# Altium integrated library GPDSE.IntLib: 634 symbols (part 6 of 7) (continued)
## ULN2804A (continued)
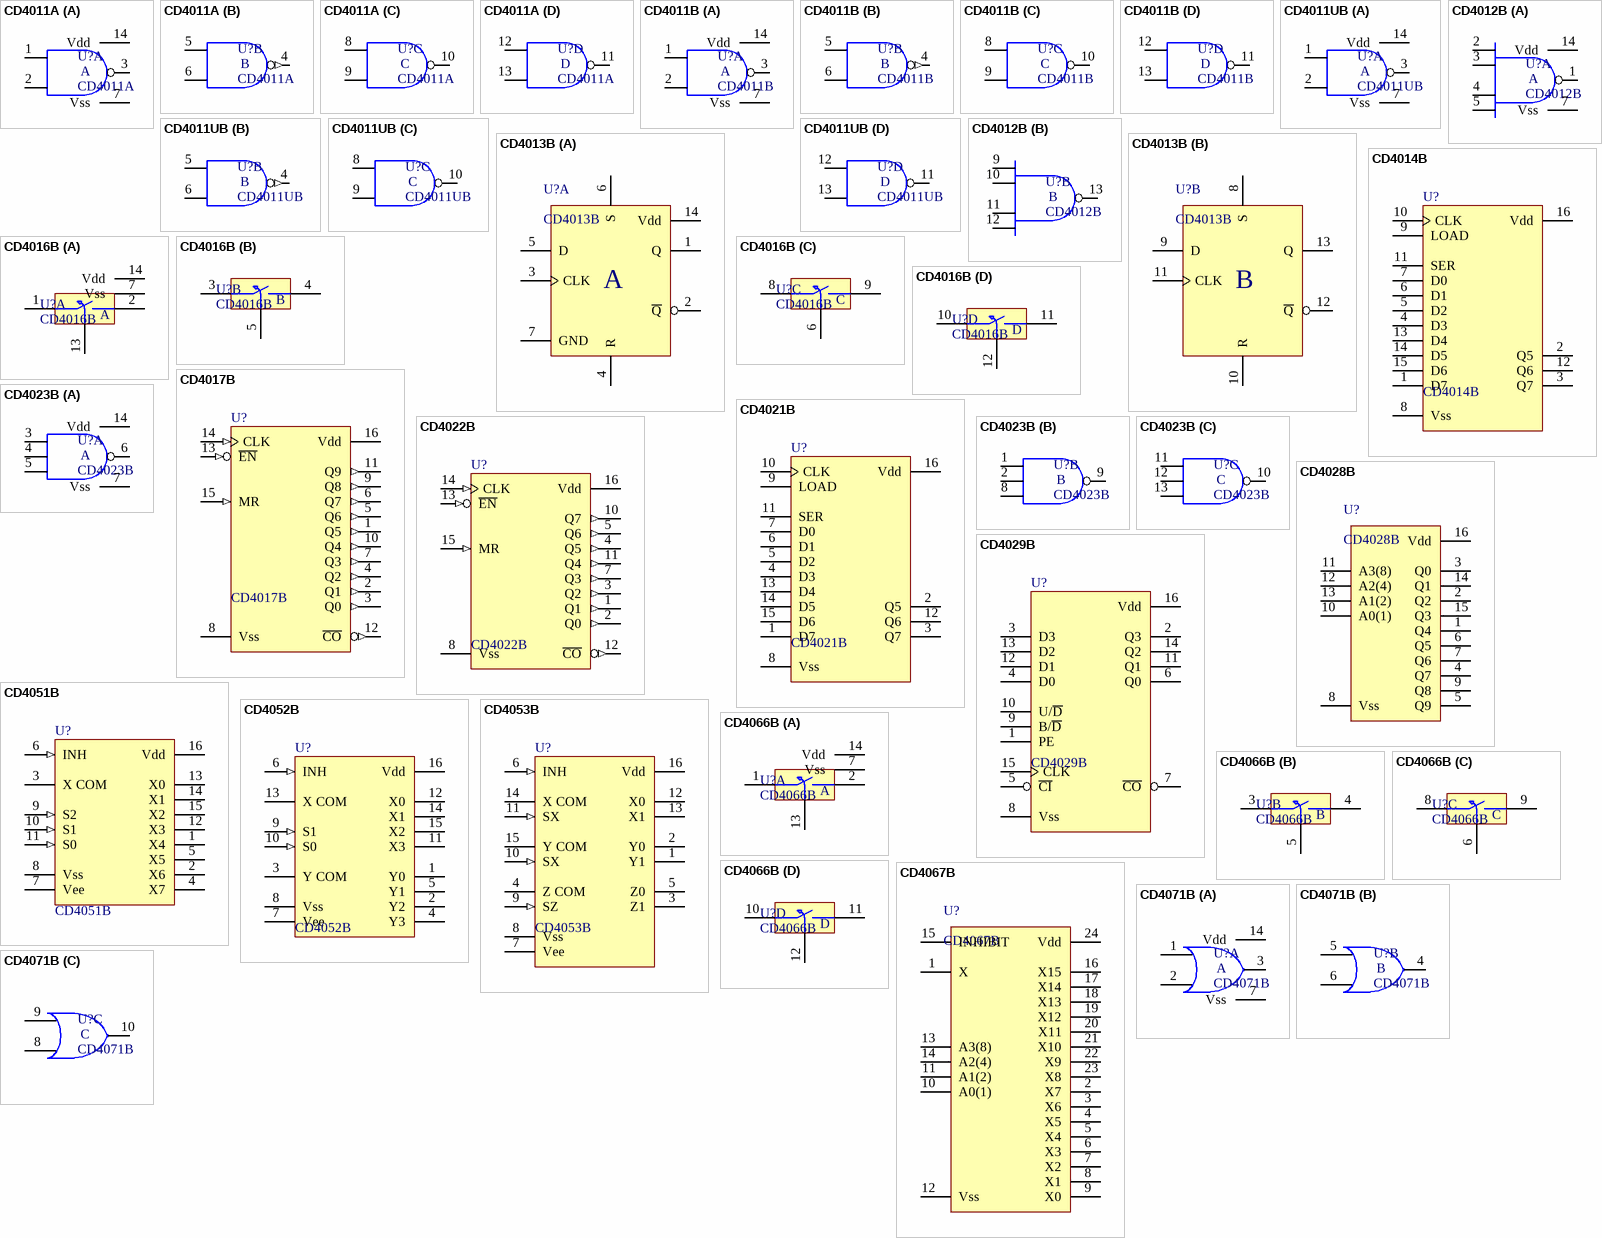
[diagram p28: symbols CD4011A to CD4071B]

## CD4011A
designator U?
[TI] Quad 2-Input NAND gates
footprint DIP14-300(100) (DIP, 14-Leads, Row Spacing 7.62mm, Pitch 2.54mm, Body 22.86x6.35mm)
part A pins: 1 A1, 2 B1, 3 Y1, 7 Vss, 14 Vdd
part B pins: 4 Y2 (out), 5 A2, 6 B2
part C pins: 8 A3, 9 B3, 10 Y3
part D pins: 11 Y4, 12 A4, 13 B4
part A text: A
part B text: B
part C text: C
part D text: D

## CD4011B
designator U?
[TI] Quad 2-Input NAND Gates
footprint DIP14-300(100) (DIP; 14 Leads; Row Spacing 7.62 mm; Pitch 2.54 mm; 3D CircuitWorks)
footprint SOIC14-150(50) (SOIC; 14 Leads; Row Spacing 3.81 mm; Pitch 1.27 mm; 3D Antonio Fagaldo)
footprint SOP14-4.4mm(0.65mm) (Thin Shrink Small Outline Package 14 pin)
footprint SOP14-5.3mm(1.27mm) (Small Outline Package 14 pin)
part A pins: 1 A1, 2 B1, 3 Y1, 7 Vss, 14 Vdd
part B pins: 4 Y2 (out), 5 A2, 6 B2
part C pins: 8 A3, 9 B3, 10 Y3
part D pins: 11 Y4, 12 A4, 13 B4
part A text: A
part B text: B
part C text: C
part D text: D

## CD4011UB
designator U?
[TI] Quad 2-Input NAND Gates
footprint DIP14-300(100) (DIP; 14 Leads; Row Spacing 7.62 mm; Pitch 2.54 mm; 3D CircuitWorks)
footprint SOIC14-150(50) (SOIC; 14 Leads; Row Spacing 3.81 mm; Pitch 1.27 mm; 3D Antonio Fagaldo)
footprint SOP14-4.4mm(0.65mm) (Thin Shrink Small Outline Package 14 pin)
footprint SOP14-5.3mm(1.27mm) (Small Outline Package 14 pin)
part A pins: 1 A1, 2 B1, 3 Y1, 7 Vss, 14 Vdd
part B pins: 4 Y2 (out), 5 A2, 6 B2
part C pins: 8 A3, 9 B3, 10 Y3
part D pins: 11 Y4, 12 A4, 13 B4
part A text: A
part B text: B
part C text: C
part D text: D

## CD4012B
designator U?
[TI] Dual 4-Input NAND Gates
footprint DIP14-300(100) (DIP; 14 Leads; Row Spacing 7.62 mm; Pitch 2.54 mm; 3D CircuitWorks)
footprint SOIC14-150(50) (SOIC; 14 Leads; Row Spacing 3.81 mm; Pitch 1.27 mm; 3D Antonio Fagaldo)
footprint SOP14-4.4mm(0.65mm) (Thin Shrink Small Outline Package 14 pin)
footprint SOP14-5.3mm(1.27mm) (Small Outline Package 14 pin)
part A pins: 1 Y1, 2 A1, 3 B1, 4 C1, 5 D1, 7 Vss, 14 Vdd
part B pins: 9 A2, 10 B2, 11 C2, 12 D2, 13 Y2
part A text: A
part B text: B

## CD4013B
designator U?
[TI] CMOS Dual D-Type Flip-Flop
footprint DIP14-300(100) (DIP, 14-Leads, Row Spacing 7.62mm, Pitch 2.54mm)
footprint SOIC14-150(50) (SOIC 14 Leads; Row Spacing 3.81 mm; Pitch 1.27 mm; 3D André L´Hérault)
footprint SOP14-4.4mm(0.65mm) (Thin Shrink Small Outline Package 14 pin)
footprint SOP14-5.3mm(1.27mm) (Small Outline Package 14 pin)
part A pins: 1 Q, 2 ~{Q}, 3 CLK, 4 R, 5 D, 6 S, 7 GND (power), 14 Vdd (power)
part B pins: 8 S, 9 D, 10 R, 11 CLK, 12 ~{Q}, 13 Q
3 alternate drawings of the same symbol
part A text: A
part B text: B

## CD4014B
designator U?
[TI] 8-Bit Shift Register with Synchronous Parallel Load
footprint DIP16-300(100) (DIP; 16 Leads; Row Spacing 7.62 mm; Pitch 2.54 mm; 3D CircuitWorks)
footprint SOIC16-150(50) (SOIC; 16 Leads; Row Spacing 3.81 mm; Pitch 1.27 mm; 3D Antonio Fagaldo)
footprint SOP16-4.4mm(0.65mm) (Thin Shrink Small Outline Package 16 pin)
pins: 1 D7, 2 Q5, 3 Q7, 4 D3, 5 D2, 6 D1, 7 D0, 8 Vss (power), 9 LOAD, 10 CLK, 11 SER, 12 Q6, 13 D4, 14 D5, 15 D6, 16 Vdd (power)

## CD4016B
designator U?
[TI] Quad Bilateral Switch
footprint DIP14-300(100) (DIP, 14-Leads, Row Spacing 7.62mm, Pitch 2.54mm)
footprint SOIC14-150(50) (Plastic Small Outline 14 pinos)
footprint SOP14-4.4mm(0.65mm) (Thin Shrink Small Outline Package 14 pin)
footprint SOP14-5.3mm(1.27mm) (Small Outline Package 14 pin)
part A pins: 1 IN/OUT, 2 OUT/IN, 7 Vss, 13 CONT, 14 Vdd
part B pins: 3 IN/OUT, 4 OUT/IN, 5 CONT
part C pins: 6 CONT, 8 IN/OUT, 9 OUT/IN
part D pins: 10 IN/OUT, 11 OUT/IN, 12 CONT
part A text: A
part B text: B
part C text: C
part D text: D

## CD4017B
designator U?
[TI] Decade Counter with 10 Decoded Outputs; Supply Voltage (Vcc): 4.75 to 5.25 V; Input Voltage (Vi): 0 to Vcc; Output High Current (Ioh): -0.8 mA; Output Low Current (Iol): 16 mA; Clock Frequency (fclock): 20 MHz; Output Voltage (Vo): 0 to Vcc
footprint DIP16-300(100) (DIP, 16-Leads, Row Spacing 7.62mm, Pitch 2.54mm, Body 22.86x6.35mm)
footprint SOIC16-150(50) (SOIC 16 Leads; Row Spacing 3.81 mm; Pitch 1.27 mm; 3D André L´Hérault)
footprint SOP16-5.3mm(1.27mm) (Small Outline Package 16 pin)
footprint SOP16-4.4mm(0.65mm) (Thin Shrink Small Outline Package 16 pin)
pins: 1 Q5 (out), 2 Q1 (out), 3 Q0 (out), 4 Q2 (out), 5 Q6 (out), 6 Q7 (out), 7 Q3 (out), 8 Vss (power), 9 Q8 (out), 10 Q4 (out), 11 Q9 (out), 12 ~{CO} (out), 13 ~{EN} (in), 14 CLK (in), 15 MR (in), 16 Vdd (power)

## CD4021B
designator U?
[TI] 8-Bit Shift Register with Asynchronous Parallel Load
footprint DIP16-300(100) (DIP; 16 Leads; Row Spacing 7.62 mm; Pitch 2.54 mm; 3D CircuitWorks)
footprint SOIC16-150(50) (SOIC; 16 Leads; Row Spacing 3.81 mm; Pitch 1.27 mm; 3D Antonio Fagaldo)
footprint SOP16-4.4mm(0.65mm) (Thin Shrink Small Outline Package 16 pin)
pins: 1 D7, 2 Q5, 3 Q7, 4 D3, 5 D2, 6 D1, 7 D0, 8 Vss (power), 9 LOAD, 10 CLK, 11 SER, 12 Q6, 13 D4, 14 D5, 15 D6, 16 Vdd (power)

## CD4022B
designator U?
[TI] Octal Counter with 8 Decoded Outputs; Supply Voltage (Vcc): 4.75 to 5.25 V; Input Voltage (Vi): 0 to Vcc; Output High Current (Ioh): -0.8 mA; Output Low Current (Iol): 16 mA; Clock Frequency (fclock): 20 MHz; Output Voltage (Vo): 0 to Vcc
footprint DIP16-300(100) (DIP, 16-Leads, Row Spacing 7.62mm, Pitch 2.54mm, Body 22.86x6.35mm)
footprint SOP16-5.3mm(1.27mm) (Small Outline Package 16 pin)
footprint SOP16-4.4mm(0.65mm) (Thin Shrink Small Outline Package 16 pin)
pins: 1 Q1 (out), 2 Q0 (out), 3 Q2 (out), 4 Q5 (out), 5 Q6 (out), 7 Q3 (out), 8 Vss (power), 10 Q7 (out), 11 Q4 (out), 12 ~{CO} (out), 13 ~{EN} (in), 14 CLK (in), 15 MR (in), 16 Vdd (power)

## CD4023B
designator U?
[TI] Triple 3-Input NAND Gates
footprint DIP14-300(100) (DIP; 14 Leads; Row Spacing 7.62 mm; Pitch 2.54 mm; 3D CircuitWorks)
footprint SOIC14-150(50) (SOIC; 14 Leads; Row Spacing 3.81 mm; Pitch 1.27 mm; 3D Antonio Fagaldo)
footprint SOP14-4.4mm(0.65mm) (Thin Shrink Small Outline Package 14 pin)
footprint SOP14-5.3mm(1.27mm) (Small Outline Package 14 pin)
part A pins: 3 A1, 4 B1, 5 C1, 6 Y1, 7 Vss, 14 Vdd
part B pins: 1 A2, 2 B2, 8 C2, 9 Y2
part C pins: 10 Y3, 11 A3, 12 B3, 13 C3
part A text: A
part B text: B
part C text: C

## CD4028B
designator U?
[TI] BCD-to-Decimal Decoder
footprint DIP16-300(100) (DIP, 16-Leads, Row Spacing 7.62mm, Pitch 2.54mm, Body 22.86x6.35mm)
footprint SOIC16-300(50) (Plastic Small Outline 16 pinos largo)
footprint SOP16-4.4mm(0.65mm) (Thin Shrink Small Outline Package 16 pin)
footprint SOP16-5.3mm(1.27mm) (Small Outline Package 16 pin)
pins: 1 Q4, 2 Q2, 3 Q0, 4 Q7, 5 Q9, 6 Q5, 7 Q6, 8 Vss, 9 Q8, 10 A0(1), 11 A3(8), 12 A2(4), 13 A1(2), 14 Q1, 15 Q3, 16 Vdd

## CD4029B
designator U?
[TI] Presettable Up/Down Counter; Supply Voltage (Vcc): 3 to 18 V; Input Voltage (Vi): 0 to Vcc; Output High Current (Ioh): -1 mA; Output Low Current (Iol): 1 mA; Clock Frequency (fclock): 5.5 MHz; Output Voltage (Vo): 0 to Vcc
footprint DIP16-300(100) (DIP, 16-Leads, Row Spacing 7.62mm, Pitch 2.54mm, Body 22.86x6.35mm)
footprint SOIC16-150(50) (SOIC 16 Leads; Row Spacing 3.81 mm; Pitch 1.27 mm; 3D André L´Hérault)
footprint SOP16-5.3mm(1.27mm) (Small Outline Package 16 pin)
footprint SOP16-4.4mm(0.65mm) (Thin Shrink Small Outline Package 16 pin)
pins: 1 PE, 2 Q3, 3 D3, 4 D0, 5 ~{CI}, 6 Q0, 7 ~{CO}, 8 Vss (power), 9 B/~{D}, 10 U/~{D}, 11 Q1, 12 D1, 13 D2, 14 Q2, 15 CLK, 16 Vdd (power)

## CD4051B
designator U?
[TI] Single 8-Channel Analog Multiplexer/Demultiplexer with Logic-Level Conversion
footprint DIP16-300(100) (DIP, 16-Leads, Row Spacing 7.62mm, Pitch 2.54mm, Body 22.86x6.35mm)
footprint SOP16-5.3mm(1.27mm) (Small Outline Package 16 pin)
footprint SOP16-4.4mm(0.65mm) (Thin Shrink Small Outline Package 16 pin)
footprint SOIC16-150(50) (SOIC 16 Leads; Row Spacing 3.81 mm; Pitch 1.27 mm; 3D André L´Hérault)
pins: 1 X4, 2 X6, 3 X COM, 4 X7, 5 X5, 6 INH (in), 7 Vee (power), 8 Vss (power), 9 S2 (in), 10 S1 (in), 11 S0 (in), 12 X3, 13 X0, 14 X1, 15 X2, 16 Vdd (power)

## CD4052B
designator U?
[TI] Single 8-Channel Analog Multiplexer/Demultiplexer with Logic-Level Conversion
footprint DIP16-300(100) (DIP, 16-Leads, Row Spacing 7.62mm, Pitch 2.54mm, Body 22.86x6.35mm)
footprint SOP16-5.3mm(1.27mm) (Small Outline Package 16 pin)
footprint SOP16-4.4mm(0.65mm) (Thin Shrink Small Outline Package 16 pin)
footprint SOIC16-150(50) (SOIC 16 Leads; Row Spacing 3.81 mm; Pitch 1.27 mm; 3D André L´Hérault)
pins: 1 Y0, 2 Y2, 3 Y COM, 4 Y3, 5 Y1, 6 INH (in), 7 Vee (power), 8 Vss (power), 9 S1 (in), 10 S0 (in), 11 X3, 12 X0, 13 X COM, 14 X1, 15 X2, 16 Vdd (power)

## CD4053B
designator U?
[TI] Single 8-Channel Analog Multiplexer/Demultiplexer with Logic-Level Conversion
footprint DIP16-300(100) (DIP, 16-Leads, Row Spacing 7.62mm, Pitch 2.54mm, Body 22.86x6.35mm)
footprint SOP16-5.3mm(1.27mm) (Small Outline Package 16 pin)
footprint SOP16-4.4mm(0.65mm) (Thin Shrink Small Outline Package 16 pin)
footprint SOIC16-150(50) (SOIC 16 Leads; Row Spacing 3.81 mm; Pitch 1.27 mm; 3D André L´Hérault)
pins: 1 Y1, 2 Y0, 3 Z1, 4 Z COM, 5 Z0, 6 INH (in), 7 Vee (power), 8 Vss (power), 9 SZ (in), 10 SX (in), 11 SX (in), 12 X0, 13 X1, 14 X COM, 15 Y COM, 16 Vdd (power)

## CD4066B
designator U?
[TI] Quad Bilateral Switch
footprint DIP14-300(100) (DIP, 14-Leads, Row Spacing 7.62mm, Pitch 2.54mm)
footprint SOIC14-150(50) (Plastic Small Outline 14 pinos)
footprint SOP14-4.4mm(0.65mm) (Thin Shrink Small Outline Package 14 pin)
footprint SOP14-5.3mm(1.27mm) (Small Outline Package 14 pin)
part A pins: 1 IN/OUT, 2 OUT/IN, 7 Vss, 13 CONT, 14 Vdd
part B pins: 3 IN/OUT, 4 OUT/IN, 5 CONT
part C pins: 6 CONT, 8 IN/OUT, 9 OUT/IN
part D pins: 10 IN/OUT, 11 OUT/IN, 12 CONT
part A text: A
part B text: B
part C text: C
part D text: D

## CD4067B
designator U?
[TI] 16-Channel Analog Multiplexer / Demultiplexer
footprint DIP24-600(100) (DIP; 24 Leads; Row Spacing 15.24 mm; Pitch 2.54 mm; 3D Michael Fiedler)
footprint SOIC24-300(50) (Plastic Small Outline 24 pin wide)
footprint SOP24-4.4mm(0.65mm) (Thin Shrink Small Outline Package 24 pin)
pins: 1 X, 2 X7, 3 X6, 4 X5, 5 X4, 6 X3, 7 X2, 8 X1, 9 X0, 10 A0(1), 11 A1(2), 12 Vss, 13 A3(8), 14 A2(4), 15 INHIBIT, 16 X15, 17 X14, 18 X13, 19 X12, 20 X11, 21 X10, 22 X9, 23 X8, 24 Vdd

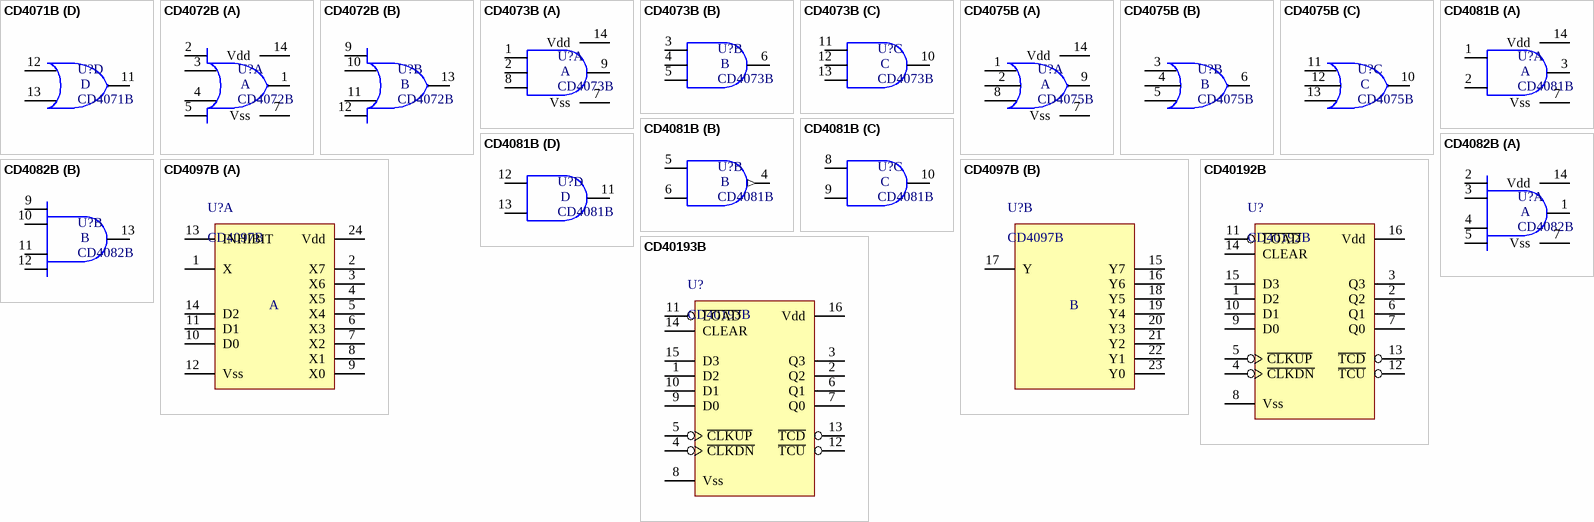
[diagram p29: symbols CD4071B to CD40193B]

## CD4071B
designator U?
[TI] Quad 2-Input OR Gates
footprint DIP14-300(100) (DIP; 14 Leads; Row Spacing 7.62 mm; Pitch 2.54 mm; 3D CircuitWorks)
footprint SOIC14-150(50) (SOIC; 14 Leads; Row Spacing 3.81 mm; Pitch 1.27 mm; 3D Antonio Fagaldo)
footprint SOP14-5.3mm(1.27mm) (Small Outline Package 14 pin)
footprint SOP14-4.4mm(0.65mm) (Thin Shrink Small Outline Package 14 pin)
part A pins: 1 A1, 2 B1, 3 Y1, 7 Vss, 14 Vdd
part B pins: 4 Y2, 5 A2, 6 B2
part C pins: 8 B3, 9 A3, 10 Y3
part D pins: 11 Y4, 12 A4, 13 B4
part A text: A
part B text: B
part C text: C
part D text: D

## CD4072B
designator U?
[TI] Dual 4-Input OR Gates
footprint DIP14-300(100) (DIP; 14 Leads; Row Spacing 7.62 mm; Pitch 2.54 mm; 3D CircuitWorks)
footprint SOIC14-150(50) (SOIC; 14 Leads; Row Spacing 3.81 mm; Pitch 1.27 mm; 3D Antonio Fagaldo)
footprint SOP14-5.3mm(1.27mm) (Small Outline Package 14 pin)
footprint SOP14-4.4mm(0.65mm) (Thin Shrink Small Outline Package 14 pin)
part A pins: 1 Y1, 2 A1, 3 B1, 4 C1, 5 D1, 7 Vss, 14 Vdd
part B pins: 9 A2, 10 B2, 11 C2, 12 D2, 13 Y2
part A text: A
part B text: B

## CD4073B
designator U?
[TI] Triple 3-Input AND Gates
footprint DIP14-300(100) (DIP, 14-Leads, Row Spacing 7.62mm, Pitch 2.54mm)
footprint SOIC14-150(50) (SOIC; 14 Leads; Row Spacing 3.81 mm; Pitch 1.27 mm; 3D Antonio Fagaldo)
footprint SOP14-4.4mm(0.65mm) (Thin Shrink Small Outline Package 14 pin)
footprint SOP14-5.3mm(1.27mm) (Small Outline Package 14 pin)
part A pins: 1 A1, 2 B1, 7 Vss, 8 C1, 9 Y1, 14 Vdd
part B pins: 3 A2, 4 B2, 5 C2, 6 Y2
part C pins: 10 Y3, 11 A3, 12 B3, 13 C3
part A text: A
part B text: B
part C text: C

## CD4075B
designator U?
[TI] Triple 3-Input OR Gates
footprint DIP14-300(100) (DIP; 14 Leads; Row Spacing 7.62 mm; Pitch 2.54 mm; 3D CircuitWorks)
footprint SOIC14-150(50) (SOIC; 14 Leads; Row Spacing 3.81 mm; Pitch 1.27 mm; 3D Antonio Fagaldo)
footprint SOP14-5.3mm(1.27mm) (Small Outline Package 14 pin)
footprint SOP14-4.4mm(0.65mm) (Thin Shrink Small Outline Package 14 pin)
part A pins: 1 A1, 2 B1, 7 Vss, 8 C1, 9 Y1, 14 Vdd
part B pins: 3 A2, 4 B2, 5 C2, 6 Y2
part C pins: 10 Y3, 11 A3, 12 B3, 13 C3
part A text: A
part B text: B
part C text: C

## CD4081B
designator U?
[TI] Quad 2-Input AND Gates
footprint DIP14-300(100) (DIP; 14 Leads; Row Spacing 7.62 mm; Pitch 2.54 mm; 3D CircuitWorks)
footprint SOIC14-150(50) (SOIC; 14 Leads; Row Spacing 3.81 mm; Pitch 1.27 mm; 3D Antonio Fagaldo)
footprint SOP14-4.4mm(0.65mm) (Thin Shrink Small Outline Package 14 pin)
footprint SOP14-5.3mm(1.27mm) (Small Outline Package 14 pin)
part A pins: 1 A1, 2 B1, 3 Y1, 7 Vss, 14 Vdd
part B pins: 4 Y2 (out), 5 A2, 6 B2
part C pins: 8 A3, 9 B3, 10 Y3
part D pins: 11 Y4, 12 A4, 13 B4
part A text: A
part B text: B
part C text: C
part D text: D

## CD4082B
designator U?
[TI] Dual 4-Input AND Gates
footprint DIP14-300(100) (DIP; 14 Leads; Row Spacing 7.62 mm; Pitch 2.54 mm; 3D CircuitWorks)
footprint SOIC14-150(50) (SOIC; 14 Leads; Row Spacing 3.81 mm; Pitch 1.27 mm; 3D Antonio Fagaldo)
footprint SOP14-4.4mm(0.65mm) (Thin Shrink Small Outline Package 14 pin)
footprint SOP14-5.3mm(1.27mm) (Small Outline Package 14 pin)
part A pins: 1 Y1, 2 A1, 3 B1, 4 C1, 5 D1, 7 Vss, 14 Vdd
part B pins: 9 A2, 10 B2, 11 C2, 12 D2, 13 Y2
part A text: A
part B text: B

## CD4097B
designator U?
[TI] Dual 8-Channel Analog Multiplexer / Demultiplexer
footprint DIP24-600(100) (DIP; 24 Leads; Row Spacing 15.24 mm; Pitch 2.54 mm; 3D Michael Fiedler)
footprint SOIC24-300(50) (Plastic Small Outline 24 pin wide)
footprint SOP24-4.4mm(0.65mm) (Thin Shrink Small Outline Package 24 pin)
part A pins: 1 X, 2 X7, 3 X6, 4 X5, 5 X4, 6 X3, 7 X2, 8 X1, 9 X0, 10 D0, 11 D1, 12 Vss, 13 INHIBIT, 14 D2, 24 Vdd
part B pins: 15 Y7, 16 Y6, 17 Y, 18 Y5, 19 Y4, 20 Y3, 21 Y2, 22 Y1, 23 Y0
part A text: A
part B text: B

## CD40192B
designator U?
[TI] Presettable Up/Down Decade Counters (Dual Clock With Reset)
footprint DIP16-300(100) (DIP; 16 Leads; Row Spacing 7.62 mm; Pitch 2.54 mm; 3D CircuitWorks)
footprint SOP16-5.3mm(1.27mm) (Small Outline Package 16 pin)
pins: 1 D2, 2 Q2, 3 Q3, 4 ~{CLKDN}, 5 ~{CLKUP}, 6 Q1, 7 Q0, 8 Vss, 9 D0, 10 D1, 11 ~{LOAD}, 12 ~{TCU}, 13 ~{TCD}, 14 CLEAR, 15 D3, 16 Vdd

## CD40193B
designator U?
[TI] Presettable Up/Down 4-bit Counters (Dual Clock With Reset)
footprint DIP16-300(100) (DIP; 16 Leads; Row Spacing 7.62 mm; Pitch 2.54 mm; 3D CircuitWorks)
footprint SOP16-5.3mm(1.27mm) (Small Outline Package 16 pin)
footprint SOP16-4.4mm(0.65mm) (Thin Shrink Small Outline Package 16 pin)
pins: 1 D2, 2 Q2, 3 Q3, 4 ~{CLKDN}, 5 ~{CLKUP}, 6 Q1, 7 Q0, 8 Vss, 9 D0, 10 D1, 11 ~{LOAD}, 12 ~{TCU}, 13 ~{TCD}, 14 CLEAR, 15 D3, 16 Vdd


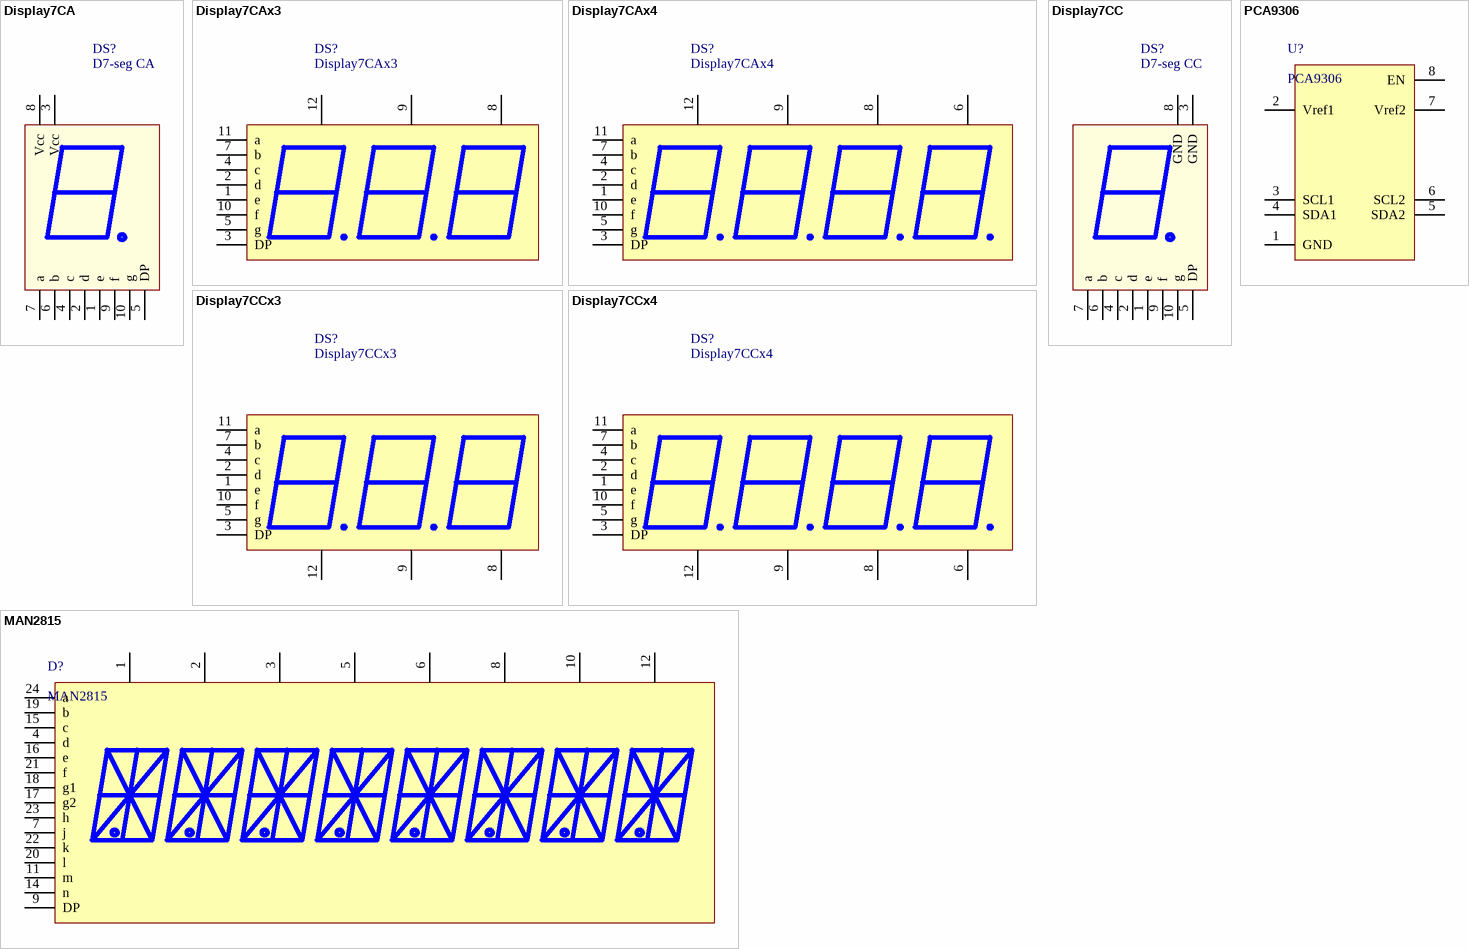
[diagram p30: symbols Display7CA to PCA9306]

## Display7CA
designator DS?, comment D7-seg CA
Seven Segments Display Common Anode
footprint D7S-13mm (Display 7 Segmentos 13 mm)
footprint D7S-10mm (Display 7 Segmentos 10 mm); pin to pad 1>4 2>5 4>7 5>6 6>9 7>10 9>2 10>1
footprint D7S-07mm (Display 7 Segmentos 7 mm); pin to pad 9>10 10>9
footprint D7S-25mm (Display 7 Segmentos 25 mm)
pins: 1 e, 2 d, 3 Vcc, 4 c, 5 DP, 6 b, 7 a, 8 Vcc, 9 f, 10 g

## Display7CAx3
designator DS?
3 Digits Seven Segments Display Common Anode
footprint D3042ASR (Triple 0.4" Display Common Anode - Ultra Bright Red)
footprint D3042AO (Triple 0.4" Display Common Anode - Red Orange)
footprint D3042AG (Triple 0.4" Display Common Anode - Yellow Green)
pins: 1 e, 2 d, 3 DP, 4 c, 5 g, 7 b, 8 D1, 9 D2, 10 f, 11 a, 12 D3

## Display7CAx4
designator DS?
4 Digits Seven Segments Display Common Anode
footprint D4156AB-14BL (Quadruple 0.56" Display Common Anode - Ultra Bright Blue)
footprint D4156AG (Quadruple 0.56" Display Common Anode - Yellow Green)
footprint D4156AO (Quadruple 0.56" Display Common Anode - Red Orange)
footprint D4156ASR (Quadruple 0.56" Display Common Anode - Ultra Bright Red)
pins: 1 e, 2 d, 3 DP, 4 c, 5 g, 6 D0, 7 b, 8 D1, 9 D2, 10 f, 11 a, 12 D3

## Display7CC
designator DS?, comment D7-seg CC
Seven Segments Display Common Cathode
footprint D7S-13mm (Display 7 Segmentos 13 mm)
footprint D7S-10mm (Display 7 Segmentos 10 mm); pin to pad 1>4 2>5 4>7 5>6 6>9 7>10 9>2 10>1
footprint D7S-07mm (Display 7 Segmentos 7 mm); pin to pad 9>10 10>9
footprint D7S-25mm (Display 7 Segmentos 25 mm)
pins: 1 e, 2 d, 3 GND, 4 c, 5 DP, 6 b, 7 a, 8 GND, 9 f, 10 g

## Display7CCx3
designator DS?
3 Digits Seven Segments Display Common Cathode
footprint D3042KSR (Triple 0.4" Display Common Cathode - Ultra Bright Red)
footprint D3042KO (Triple 0.4" Display Common Cathode - Red Orange)
footprint D3042KG (Triple 0.4" Display Common Cathode - Yellow Green)
pins: 1 e, 2 d, 3 DP, 4 c, 5 g, 7 b, 8 D1, 9 D2, 10 f, 11 a, 12 D3

## Display7CCx4
designator DS?
4 Digits Seven Segments Display Common Cathode
footprint D4156KB-14BL (Footprint not found)
footprint D4156KG (Footprint not found)
footprint D4156KO (Footprint not found)
footprint D4156KSR (Footprint not found)
pins: 1 e, 2 d, 3 DP, 4 c, 5 g, 6 D0, 7 b, 8 D1, 9 D2, 10 f, 11 a, 12 D3

## MAN2815
designator D?
8-Digits 14-Segments Alfanumeric Common Cathode Display
footprint MAN2815 (8-Digits 14-Segments Alfanumeric Common Cathode Display)
pins: 1 D7, 2 D6, 3 D5, 4 d, 5 D4, 6 D3, 7 j, 8 D2, 9 DP, 10 D1, 11 m, 12 D0, 14 n, 15 c, 16 e, 17 g2, 18 g1, 19 b, 20 l, 21 f, 22 k, 23 h, 24 a

## PCA9306
designator U?
Dual Bidirectional I2C Bus and SMBus Voltage-Level Translator; Reference Voltage (Vref): 0 - 5.5 V
footprint SOP08-2.8mm(0.65mm) (Small Outline Package; 8 leads; Row Spacing 2.8 mm; Pitch 0.65 mm)
pins: 1 GND, 2 Vref1, 3 SCL1, 4 SDA1, 5 SDA2, 6 SCL2, 7 Vref2, 8 EN


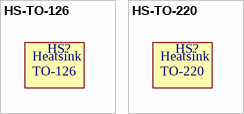
[diagram p31: symbols HS-TO-126 to HS-TO-220]

## HS-TO-126
designator HS?  (value not drawn)
Heatsink TO-126
footprint HS-TO-126-180847 (Heatsink TO-126 180847)
text: Heatsink; TO-126

## HS-TO-220
designator HS?  (value not drawn)
Heatsink TO-220
footprint HS-TO-220-180847 (Heatsink TO-220 180847 180847 19x9.5x19mm)
footprint HS-TO-220-183003-50 (Heatsink TO-220 183003-50 70x21x50mm)
footprint HS-TO-220-183004-37 (Heatsink TO-220 183004-37 86x20x37mm)
footprint HS-TO-220-183012 (Heatsink TO220 183012)
text: Heatsink; TO-220


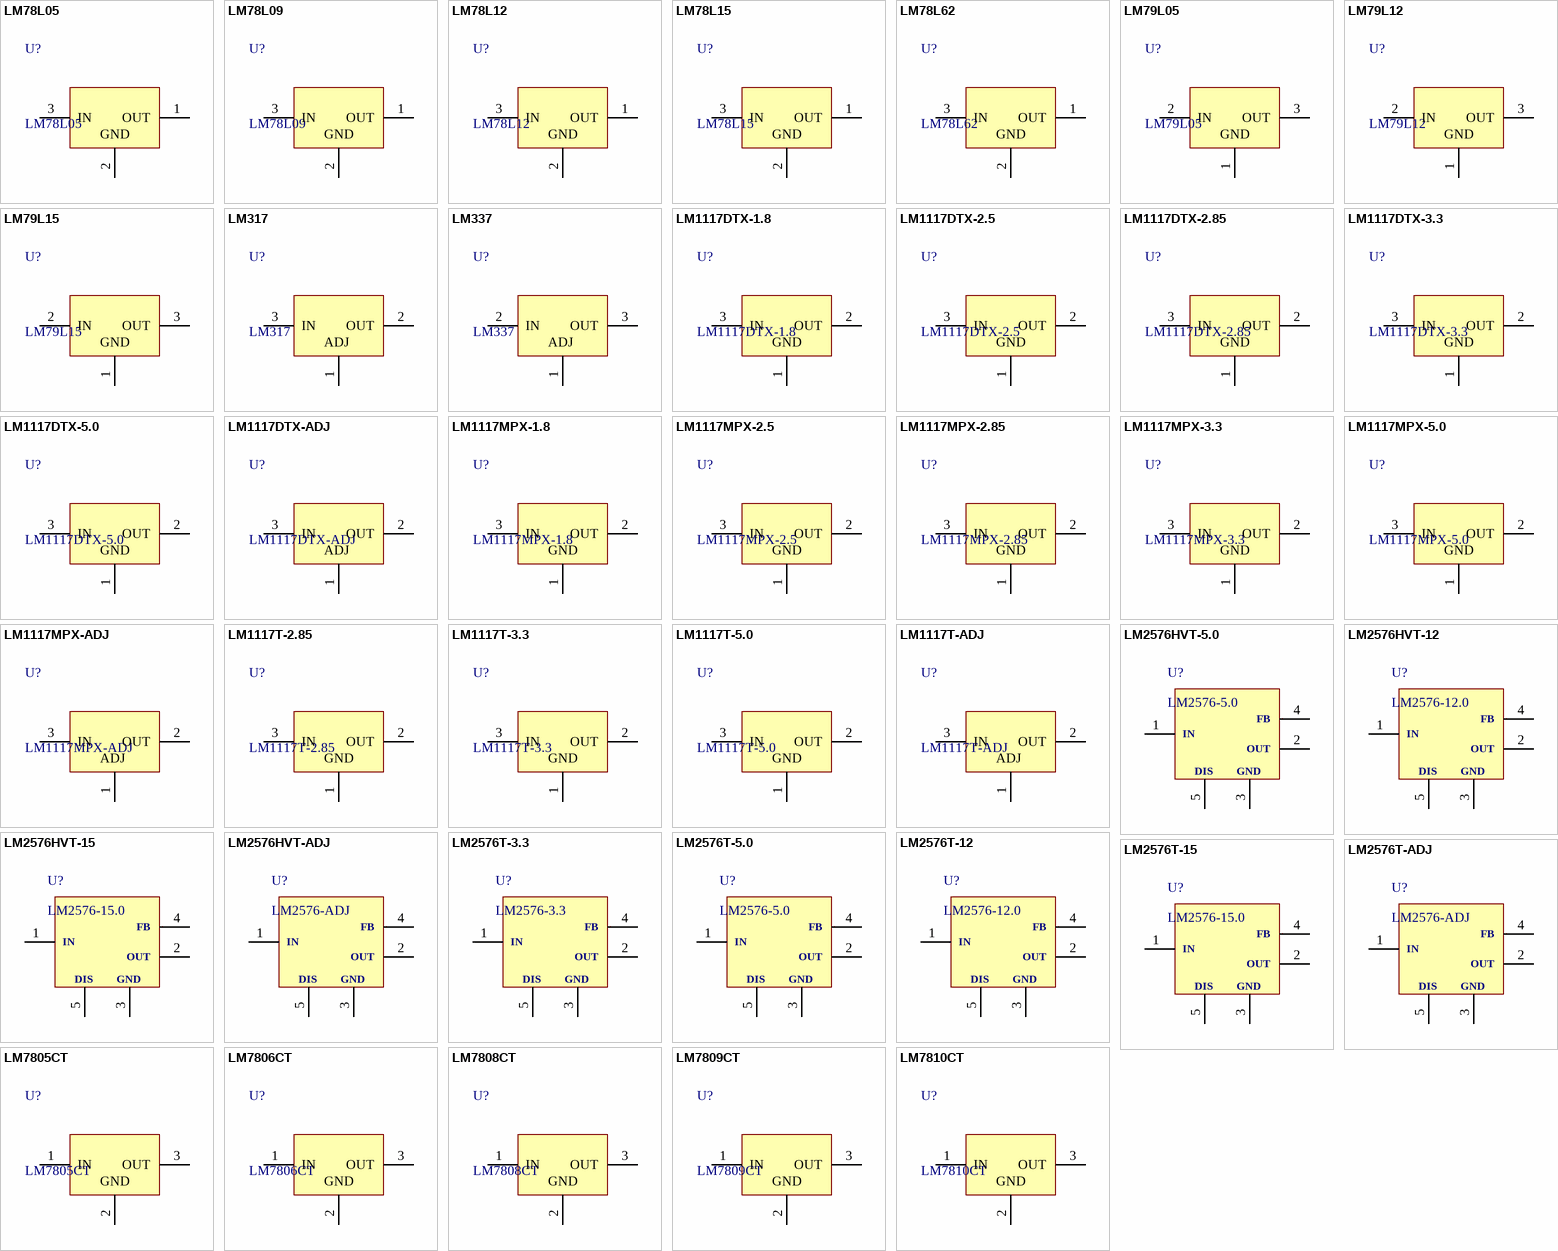
[diagram p32: symbols LM78L05 to LM7810CT]

## LM78L05
designator U?
3-Terminal 100 mA Positive 5 V Voltage Regulator
footprint TO-92/123 (Transistor Outline Package, Case Style 92 123; 3D Sergey Atanov)
pins: 1 OUT, 2 GND, 3 IN

## LM78L09
designator U?
3-Terminal 100 mA Positive 9 V Voltage Regulator
footprint TO-92/123 (Transistor Outline Package, Case Style 92 123; 3D Sergey Atanov)
pins: 1 OUT, 2 GND, 3 IN

## LM78L12
designator U?
3-Terminal 100 mA Positive 12 V Voltage Regulator
footprint TO-92/123 (Transistor Outline Package, Case Style 92 123; 3D Sergey Atanov)
pins: 1 OUT, 2 GND, 3 IN

## LM78L15
designator U?
3-Terminal 100 mA Positive 15 V Voltage Regulator
footprint TO-92/123 (Transistor Outline Package, Case Style 92 123; 3D Sergey Atanov)
pins: 1 OUT, 2 GND, 3 IN

## LM78L62
designator U?
3-Terminal 100 mA Positive 6.2 V Voltage Regulator
footprint TO-92/123 (Transistor Outline Package, Case Style 92 123; 3D Sergey Atanov)
pins: 1 OUT, 2 GND, 3 IN

## LM79L05
designator U?
3-Terminal 100 mA Negative 5 V Voltage Regulator
footprint TO-92/123 (Transistor Outline Package, Case Style 92 123; 3D Sergey Atanov)
pins: 1 GND, 2 IN, 3 OUT

## LM79L12
designator U?
3-Terminal 100 mA Negative 12 V Voltage Regulator
footprint TO-92/123 (Transistor Outline Package, Case Style 92 123; 3D Sergey Atanov)
pins: 1 GND, 2 IN, 3 OUT

## LM79L15
designator U?
3-Terminal 100 mA Negative 15 V Voltage Regulator
footprint TO-92/123 (Transistor Outline Package, Case Style 92 123; 3D Sergey Atanov)
pins: 1 GND, 2 IN, 3 OUT

## LM317
designator U?
3-Terminal 1.5 A Positive Adjustable Voltage Regulator
footprint TO-220/123 (TO, Thru-Hole, Vertical, Heatsink Mounted; 3 In-Line Leads; Pitch 2.54 mm)
footprint SOT-223/4 (SOT-223 DCY)
pins: 1 ADJ, 2 OUT, 3 IN

## LM337
designator U?
3-Terminal 1.5 A Negative Adjustable Voltage Regulator
footprint TO-220/123 (TO, Thru-Hole, Vertical, Heatsink Mounted; 3 In-Line Leads; Pitch 2.54 mm)
footprint SOT-223/4 (SOT-223 DCY)
pins: 1 ADJ, 2 IN, 3 OUT

## LM1117DTX-1.8
designator U?
Positive 1.8 V Regulator
footprint TO-252/4 (PowerFLEX Plastic Flange-Mount)
pins: 1 GND, 2 OUT, 3 IN

## LM1117DTX-2.5
designator U?
Positive 2.5 V Regulator
footprint TO-252/4 (PowerFLEX Plastic Flange-Mount)
pins: 1 GND, 2 OUT, 3 IN

## LM1117DTX-2.85
designator U?
Positive 2.85 V Regulator
footprint TO-252/4 (PowerFLEX Plastic Flange-Mount)
pins: 1 GND, 2 OUT, 3 IN

## LM1117DTX-3.3
designator U?
Positive 3.3 V Regulator
footprint TO-252/4 (PowerFLEX Plastic Flange-Mount)
pins: 1 GND, 2 OUT, 3 IN

## LM1117DTX-5.0
designator U?
Positive 5 V Regulator
footprint TO-252/4 (PowerFLEX Plastic Flange-Mount)
pins: 1 GND, 2 OUT, 3 IN

## LM1117DTX-ADJ
designator U?
Positive Adjustable Regulator
footprint TO-252/4 (PowerFLEX Plastic Flange-Mount)
pins: 1 ADJ, 2 OUT, 3 IN

## LM1117MPX-1.8
designator U?
Positive 1.8 V Regulator
footprint SOT-223/4 (SOT-223 DCY)
pins: 1 GND, 2 OUT, 3 IN

## LM1117MPX-2.5
designator U?
Positive 2.5 V Regulator
footprint SOT-223/4 (SOT-223 DCY)
pins: 1 GND, 2 OUT, 3 IN

## LM1117MPX-2.85
designator U?
Positive 2.85 V Regulator
footprint SOT-223/4 (SOT-223 DCY)
pins: 1 GND, 2 OUT, 3 IN

## LM1117MPX-3.3
designator U?
Positive 3.3 V Regulator
footprint SOT-223/4 (SOT-223 DCY)
pins: 1 GND, 2 OUT, 3 IN

## LM1117MPX-5.0
designator U?
Positive 5 V Regulator
footprint SOT-223/4 (SOT-223 DCY)
pins: 1 GND, 2 OUT, 3 IN

## LM1117MPX-ADJ
designator U?
Positive Adjustable Regulator
footprint SOT-223/4 (SOT-223 DCY)
pins: 1 ADJ, 2 OUT, 3 IN

## LM1117T-2.85
designator U?
Positive 2.85 V Regulator
footprint TO-220/123 (TO, Thru-Hole, Vertical, Heatsink Mounted; 3 In-Line Leads; Pitch 2.54 mm)
pins: 1 GND, 2 OUT, 3 IN

## LM1117T-3.3
designator U?
Positive 3.3 V Regulator
footprint TO-220/123 (TO, Thru-Hole, Vertical, Heatsink Mounted; 3 In-Line Leads; Pitch 2.54 mm)
pins: 1 GND, 2 OUT, 3 IN

## LM1117T-5.0
designator U?
Positive 5 V Regulator
footprint TO-220/123 (TO, Thru-Hole, Vertical, Heatsink Mounted; 3 In-Line Leads; Pitch 2.54 mm)
pins: 1 GND, 2 OUT, 3 IN

## LM1117T-ADJ
designator U?
Positive Adjustable Regulator
footprint TO-220/123 (TO, Thru-Hole, Vertical, Heatsink Mounted; 3 In-Line Leads; Pitch 2.54 mm)
pins: 1 ADJ, 2 OUT, 3 IN

## LM2576HVT-5.0
designator U?, comment LM2576-5.0
Simple Switcher 3 A Step-Down Voltage Regulator
footprint TO-220-5 (TO, Thru-Hole, Vertical, Heatsink Mounted; 5 Zig-Zag Leads; Pitch 1.7 mm)
pins: 1 Vin, 2 Vout, 3 GND, 4 FeedBack, 5 ~{ON}/OFF
text: FB; IN; OUT; DIS

## LM2576HVT-12
designator U?, comment LM2576-12.0
Simple Switcher 3 A Step-Down Voltage Regulator
footprint TO-220-5 (TO, Thru-Hole, Vertical, Heatsink Mounted; 5 Zig-Zag Leads; Pitch 1.7 mm)
pins: 1 Vin, 2 Vout, 3 GND, 4 FeedBack, 5 ~{ON}/OFF
text: FB; IN; OUT; DIS

## LM2576HVT-15
designator U?, comment LM2576-15.0
Simple Switcher 3 A Step-Down Voltage Regulator
footprint TO-220-5 (TO, Thru-Hole, Vertical, Heatsink Mounted; 5 Zig-Zag Leads; Pitch 1.7 mm)
pins: 1 Vin, 2 Vout, 3 GND, 4 FeedBack, 5 ~{ON}/OFF
text: FB; IN; OUT; DIS

## LM2576HVT-ADJ
designator U?, comment LM2576-ADJ
Simple Switcher 3 A Step-Down Voltage Regulator
footprint TO-220-5 (TO, Thru-Hole, Vertical, Heatsink Mounted; 5 Zig-Zag Leads; Pitch 1.7 mm)
pins: 1 Vin, 2 Vout, 3 GND, 4 FeedBack, 5 ~{ON}/OFF
text: FB; IN; OUT; DIS

## LM2576T-3.3
designator U?, comment LM2576-3.3
Simple Switcher 3 A Step-Down Voltage Regulator
footprint TO-220-5 (TO, Thru-Hole, Vertical, Heatsink Mounted; 5 Zig-Zag Leads; Pitch 1.7 mm)
pins: 1 Vin, 2 Vout, 3 GND, 4 FeedBack, 5 ~{ON}/OFF
text: FB; IN; OUT; DIS

## LM2576T-5.0
designator U?, comment LM2576-5.0
Simple Switcher 3 A Step-Down Voltage Regulator
footprint TO-220-5 (TO, Thru-Hole, Vertical, Heatsink Mounted; 5 Zig-Zag Leads; Pitch 1.7 mm)
pins: 1 Vin, 2 Vout, 3 GND, 4 FeedBack, 5 ~{ON}/OFF
text: FB; IN; OUT; DIS

## LM2576T-12
designator U?, comment LM2576-12.0
Simple Switcher 3 A Step-Down Voltage Regulator
footprint TO-220-5 (TO, Thru-Hole, Vertical, Heatsink Mounted; 5 Zig-Zag Leads; Pitch 1.7 mm)
pins: 1 Vin, 2 Vout, 3 GND, 4 FeedBack, 5 ~{ON}/OFF
text: FB; IN; OUT; DIS

## LM2576T-15
designator U?, comment LM2576-15.0
Simple Switcher 3 A Step-Down Voltage Regulator
footprint TO-220-5 (TO, Thru-Hole, Vertical, Heatsink Mounted; 5 Zig-Zag Leads; Pitch 1.7 mm)
pins: 1 Vin, 2 Vout, 3 GND, 4 FeedBack, 5 ~{ON}/OFF
text: FB; IN; OUT; DIS

## LM2576T-ADJ
designator U?, comment LM2576-ADJ
Simple Switcher 3 A Step-Down Voltage Regulator
footprint TO-220-5 (TO, Thru-Hole, Vertical, Heatsink Mounted; 5 Zig-Zag Leads; Pitch 1.7 mm)
pins: 1 Vin, 2 Vout, 3 GND, 4 FeedBack, 5 ~{ON}/OFF
text: FB; IN; OUT; DIS

## LM7805CT
designator U?
3-Terminal 1 A Positive 5 V Voltage Regulator
footprint TO-220/123 (TO, Thru-Hole, Vertical, Heatsink Mounted; 3 In-Line Leads; Pitch 2.54 mm)
pins: 1 IN, 2 GND, 3 OUT